# Altium footprint library PcbLib1.PcbLib: 136 footprints (part 2 of 9)
Each footprint in its own frame and in the unit in brackets; x right, y up, seen from the top. Pads: shape width x height; smd on the part's side, far side on the other; paste and mask are expansions set on the pad; w line width, h text height; cw(c..) or ccw(c..) is an arc to the next point about the centre after c.
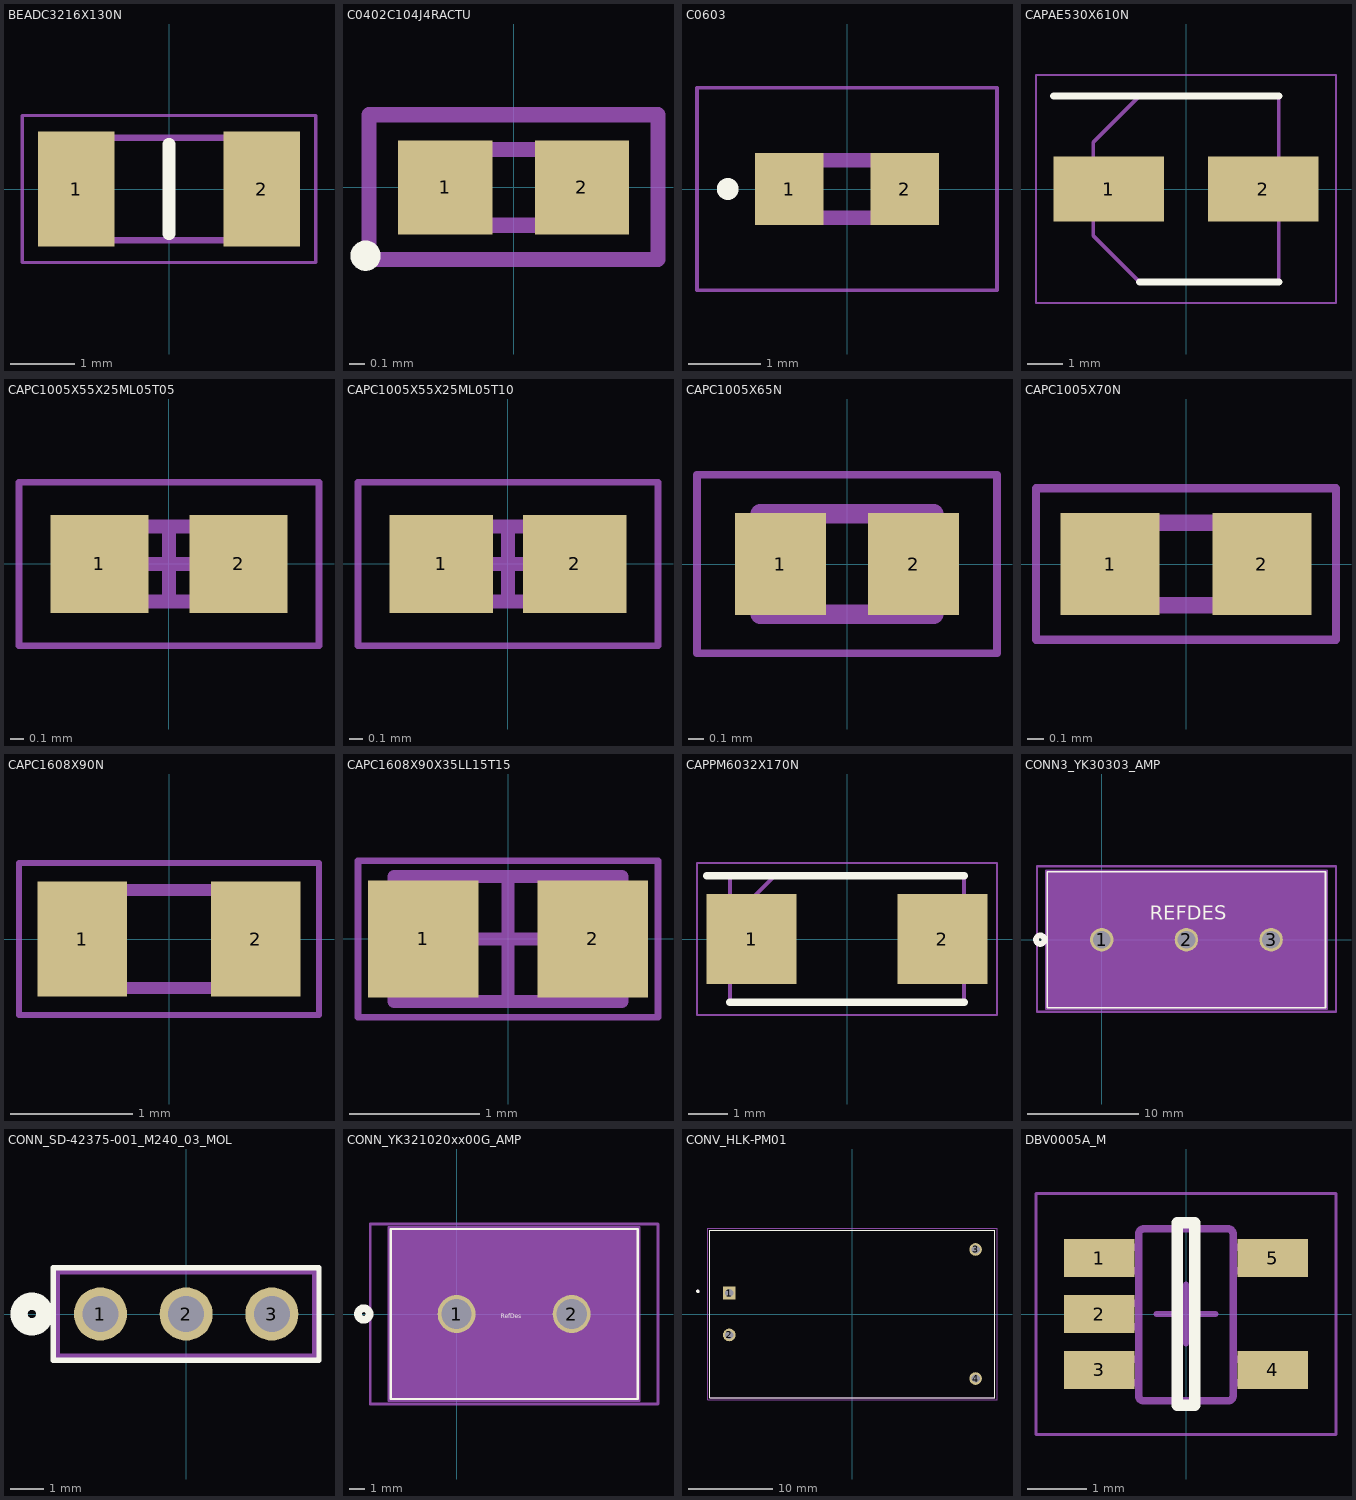
[diagram p1: the footprints below, top view; thin cyan lines are the x and y axes]

## BEADC3216X130N [mm]
pads (2):
  rect 1.2x1.8 smd: 1(-1.45,0) 2(1.45,0)
Top Overlay:
  lines w0.2: 0,-0.7 0,0.7
Mechanical 13:
  lines w0.1: -1.6,-0.8 -1.6,0.8 1.6,0.8 1.6,-0.8 -1.6,-0.8
Mechanical 15:
  lines w0.05: -2.3,-1.15 -2.3,1.15 2.3,1.15 2.3,-1.15 -2.3,-1.15
3D body "ILHB1206ER121V.stp": height 1.3, standoff 0, extent -1.6,-0.8 1.6,0.8

## C0402C104J4RACTU [mm]
pads (2):
  rect 0.62x0.62 smd: 1(-0.45,0) 2(0.45,0)
Top Overlay:
  lines w0.1: -0.975,-0.5 cw(c-0.975,-0.45) -0.975,-0.4 cw(c-0.975,-0.45) -0.975,-0.5
Mechanical 13:
  lines w0.1: -0.5,-0.25 0.5,-0.25 0.5,0.25 -0.5,0.25 -0.5,-0.25
Mechanical 15:
  lines w0.1: -0.952,-0.476 0.951,-0.476 0.951,0.478 -0.952,0.478 -0.952,-0.476
3D body "C0402C102J4GACTU.stp": height 0.55, standoff 0, extent -0.52,-0.28 0.53,0.27

## C0603 [mm]
pads (2):
  rect 0.95x1 smd: 1(-0.8,0) 2(0.8,0)
Top Overlay:
  circle w0.2: c-1.65,0 r0.05
Mechanical 13:
  lines w0.2: -0.8,-0.4 0.8,-0.4 0.8,0.4 -0.8,0.4 -0.8,-0.4
Mechanical 15:
  lines w0.05: -2.075,-1.4 2.075,-1.4 2.075,1.4 -2.075,1.4 -2.075,-1.4
3D body "C0603S103K4RACTU.stp": height 0.87, standoff 0, extent -0.87,-0.48 0.88,0.47

## CAPAE530X610N [mm]
pads (2):
  rect 3.15x1.85 smd: 1(-2.2,0) 2(2.2,0)
Top Overlay:
  lines w0.2: -3.775,2.65 2.65,2.65 ; -1.325,-2.65 2.65,-2.65
Top Courtyard:
  lines w0.05: -4.275,-3.25 4.275,-3.25 4.275,3.25 -4.275,3.25 -4.275,-3.25
Top 3D Body:
  lines w0.1: -2.65,-1.325 -2.65,1.325 -1.325,2.65 2.65,2.65 2.65,-2.65 -1.325,-2.65 -2.65,-1.325
3D body "EMZA160ARA470ME61G.stp": height 5.8, standoff 0, extent -2.95,-2.65 2.95,2.65

## CAPC1005X55X25ML05T05 [mm]
pads (2):
  rect 0.72x0.72 smd: 1(-0.51,0) 2(0.51,0)
Top Courtyard:
  lines w0.05: -1.1,-0.6 -1.1,0.6 1.1,0.6 1.1,-0.6 -1.1,-0.6
  lines w0.1: -0.275,0 0.275,0 ; 0,-0.275 0,0.275
Top 3D Body:
  lines w0.1: -0.525,-0.275 -0.525,0.275 0.525,0.275 0.525,-0.275 -0.525,-0.275
3D body: height 0.55, standoff 0, extent -0.275,-0.275 0.275,0.275
3D body: height 0.55, standoff 0, extent -0.525,-0.275 -0.275,0.275
3D body: height 0.55, standoff 0, extent 0.275,-0.275 0.525,0.275

## CAPC1005X55X25ML05T10 [mm]
pads (2):
  rect 0.76x0.72 smd: 1(-0.49,0) 2(0.49,0)
Top Courtyard:
  lines w0.05: -1.1,-0.6 1.1,-0.6 1.1,0.6 -1.1,0.6 -1.1,-0.6
  lines w0.1: -0.275,0 0.275,0 ; 0,-0.275 0,0.275
Top 3D Body:
  lines w0.1: -0.525,-0.275 0.525,-0.275 0.525,0.275 -0.525,0.275 -0.525,-0.275
3D body: height 0.55, standoff 0, extent 0.275,-0.275 0.525,0.275
3D body: height 0.55, standoff 0, extent -0.525,-0.275 -0.275,0.275
3D body: height 0.55, standoff 0, extent -0.275,-0.275 0.275,0.275

## CAPC1005X65N [mm]
pads (2):
  rect 0.6x0.67 smd: 1(-0.437,0) 2(0.437,0)
Mechanical 13:
  lines w0.127: -0.57,-0.33 -0.57,0.33 0.57,0.33 0.57,-0.33 -0.57,-0.33
Mechanical 15:
  lines w0.05: -0.985,-0.585 -0.985,0.585 0.985,0.585 0.985,-0.585 -0.985,-0.585
3D body "step_temp.STEP": height 0.65, standoff 0, extent -0.5,-0.25 0.5,0.25

## CAPC1005X70N [mm]
pads (2):
  rect 0.6x0.62 smd: 1(-0.46,0) 2(0.46,0)
Mechanical 13:
  lines w0.1: -0.5,-0.25 -0.5,0.25 0.5,0.25 0.5,-0.25 -0.5,-0.25
Mechanical 15:
  lines w0.05: -0.91,-0.46 -0.91,0.46 0.91,0.46 0.91,-0.46 -0.91,-0.46
3D body "GRM155R71E103KA01D.stp": height 0.5, standoff 0, extent -0.5,-0.25 0.5,0.25

## CAPC1608X90N [mm]
pads (2):
  rect 0.73x0.94 smd: 1(-0.71,0) 2(0.71,0)
Mechanical 13:
  lines w0.1: -0.8,-0.4 0.8,-0.4 0.8,0.4 -0.8,0.4 -0.8,-0.4
Mechanical 15:
  lines w0.05: -1.225,-0.62 1.225,-0.62 1.225,0.62 -1.225,0.62 -1.225,-0.62
3D body "CL10A475KO8NNNC.stp": height 0.9, standoff 0, extent -0.8,-0.4 0.8,0.4

## CAPC1608X90X35LL15T15 [mm]
pads (2):
  rect 0.85x0.9 smd: 1(-0.65,0) 2(0.65,0)
Top Courtyard:
  lines w0.05: -1.15,-0.6 1.15,-0.6 1.15,0.6 -1.15,0.6 -1.15,-0.6
  lines w0.1: -0.48,0 0.48,0 ; 0,-0.48 0,0.48
Top 3D Body:
  lines w0.1: -0.875,-0.48 0.875,-0.48 0.875,0.48 -0.875,0.48 -0.875,-0.48
3D body: height 0.9, standoff 0, extent 0.525,-0.48 0.875,0.48
3D body: height 0.9, standoff 0, extent -0.875,-0.48 -0.525,0.48
3D body: height 0.9, standoff 0, extent -0.525,-0.48 0.525,0.48

## CAPPM6032X170N [mm]
pads (2):
  rect 2.3x2.3 smd: 1(-2.45,0) 2(2.45,0)
Top Overlay:
  lines w0.2: -3.6,1.625 3,1.625 ; -3,-1.625 3,-1.625
Top Courtyard:
  lines w0.05: -3.85,-1.95 3.85,-1.95 3.85,1.95 -3.85,1.95 -3.85,-1.95
Top 3D Body:
  lines w0.1: -3,0.475 -1.85,1.625 ; -3,-1.625 3,-1.625 3,1.625 -3,1.625 -3,-1.625
3D body "TLJA107M010R1400.stp": height 1.7, standoff 0, extent -3,-1.625 3,1.625

## CONN3_YK30303_AMP [mil]
pads (3):
  round 83 / inner round 60 / far side round 83 hole 63 paste-99999 mask+0: 1(0,0) 2(300,0) 3(600,0)
Top Overlay:
  circle w20: c-218,0 r15
  lines w6: -193,-241 -193,241 793,241 793,-241 -193,-241
  text "REFDES" at 170,70 h50
Bottom Overlay:
  circle w20: c-218,0 r15
Mechanical 1:
  lines w7.68: -230,-255 830,-255 830,260 -230,260 -230,-255
Mechanical 13:
  lines w1: -188,-236 -188,236 788,236 788,-236 -188,-236
Mechanical 15:
  region: 798,246 -198,246 -198,-246 798,-246
  lines w6: -198,-246 798,-246 798,246 -198,246 -198,-246

## CONN_SD-42375-001_M240_03_MOL [mil] "3-PIN HEADER 2.54MM PITCH"
pads (3):
  round 62 hole 42: 1(-100,0) 2(0,0) 3(100,0)
Top Overlay:
  lines w6: -155,-54 155,-54 155,54 -155,54 -155,-54
  lines w20: -195,0 ccw(c-180,0) -165,0 ccw(c-180,0) -195,0
Bottom Overlay:
  lines w20: -195,0 ccw(c-180,0) -165,0 ccw(c-180,0) -195,0
Mechanical 13:
  lines w6: -150,-49 150,-49 150,49 -150,49 -150,-49
3D body "022284036.stp": height 315, standoff -140, extent -150,-49 150,49

## CONN_YK321020xx00G_AMP [mil]
pads (2):
  round 99 / inner round 60 / far side round 99 hole 79 paste-99999 mask+0: 1(0,0) 2(300,0)
Top Overlay:
  circle w20: c-242,0 r15
  lines w6: -172,-221.5 472,-221.5 472,221.5 -172,221.5 -172,-221.5
  text "RefDes" at 115,-15 h20
Bottom Overlay:
  circle w20: c-242,0 r15
Mechanical 1:
  lines w7.68: -225,-235 525,-235 525,235 -225,235 -225,-235
Mechanical 13:
  lines w1: -167,-216.5 467,-216.5 467,216.5 -167,216.5 -167,-216.5
Mechanical 15:
  region: 477,226.5 -177,226.5 -177,-226.5 477,-226.5
  lines w6: -177,-226.5 -177,226.5 477,226.5 477,-226.5 -177,-226.5

## CONV_HLK-PM01 [mm]
height 15
pads (4):
  rect 1.508x1.508 / inner round 1.508 / far side rect 1.508x1.508 hole 1: 1(-14.7,2.5)
  round 1.508 hole 1: 2(-14.7,-2.5) 3(14.7,7.7) 4(14.7,-7.7)
Top Overlay:
  circle w0.2: c-18.45,2.7 r0.1
  lines w0.127: -17,-10 -17,10 17,10 17,-10 -17,-10
Mechanical 13:
  circle w0.2: c-18.45,2.7 r0.1
  lines w0.127: -17,-10 -17,10 17,10 17,-10 -17,-10
Mechanical 15:
  lines w0.05: -17.25,-10.25 -17.25,10.25 17.25,10.25 17.25,-10.25 -17.25,-10.25
3D body "step_temp.STEP": height 15, standoff -5, extent -17,-10.1 17,10.1

## DBV0005A_M [mm]
pads (5):
  rect 1.2x0.65 smd paste+0 mask+0: 1(-1.475,0.95) 2(-1.475,0) 3(-1.475,-0.95) 4(1.475,-0.95) 5(1.475,0.95)
Top Overlay:
  lines w0.2: -0.15,-1.55 -0.15,1.55 0.15,1.55 0.15,-1.55 -0.15,-1.55
Mechanical 13:
  lines w0.127: -0.801,1.371 cw(c-0.725,1.37) -0.725,1.446 ; -0.801,1.37 -0.801,-1.399 -0.801,-1.4 ccw(c-0.725,-1.399) -0.725,-1.475 ; -0.801,1.37 -0.801,1.371 ; -0.725,-1.475 -0.725,-1.475 ; -0.725,-1.475 0.723,-1.475 0.724,-1.475 ccw(c0.723,-1.399) 0.799,-1.4 0.799,-1.399 0.799,1.37 ; -0.725,1.446 0.723,1.446 0.724,1.446 cw(c0.723,1.37) 0.799,1.371 ; -0.725,1.446 -0.725,1.446 ; 0.799,1.37 0.799,1.371 ; -1.423,-1.167 -1.199,-1.167 -1.105,-1.167 -1.088,-1.167 -0.835,-1.167 -0.801,-1.167 -0.801,-0.767 -0.835,-0.767 -1.088,-0.767 -1.105,-0.767 -1.199,-0.767 -1.423,-0.767 -1.423,-1.167 ; -1.423,-0.215 -1.199,-0.215 -1.105,-0.215 -1.088,-0.215 -0.835,-0.215 -0.801,-0.215 -0.801,0.186 -0.835,0.186 -1.088,0.186 -1.105,0.186 -1.199,0.186 -1.423,0.186 -1.423,-0.215 ; -1.423,0.738 -1.199,0.738 -1.105,0.738 -1.088,0.738 -0.835,0.738 -0.801,0.738 -0.801,1.138 -0.835,1.138 -1.088,1.138 -1.105,1.138 -1.199,1.138 -1.423,1.138 -1.423,0.738 ; 0.799,-1.167 0.799,-0.767 0.834,-0.767 1.087,-0.767 1.103,-0.767 1.198,-0.767 1.422,-0.767 1.422,-1.167 1.198,-1.167 1.103,-1.167 1.087,-1.167 0.834,-1.167 0.799,-1.167 ; 0.799,0.738 0.799,1.138 0.834,1.138 1.087,1.138 1.103,1.138 1.198,1.138 1.422,1.138 1.422,0.738 1.198,0.738 1.103,0.738 1.087,0.738 0.834,0.738 0.799,0.738
Mechanical 15:
  lines w0.05: -2.55,-2.05 -2.55,2.05 2.55,2.05 2.55,-2.05 -2.55,-2.05
  lines w0.1: -0.5,0 0.5,0 ; 0,-0.5 0,0.5